# Altium footprint library My Library.PCBLIB: 198 footprints (part 12 of 13)
Each footprint in its own frame and in the unit in brackets; x right, y up, seen from the top. Pads: shape width x height; smd on the part's side, far side on the other; paste and mask are expansions set on the pad; w line width, h text height; cw(c..) or ccw(c..) is an arc to the next point about the centre after c.
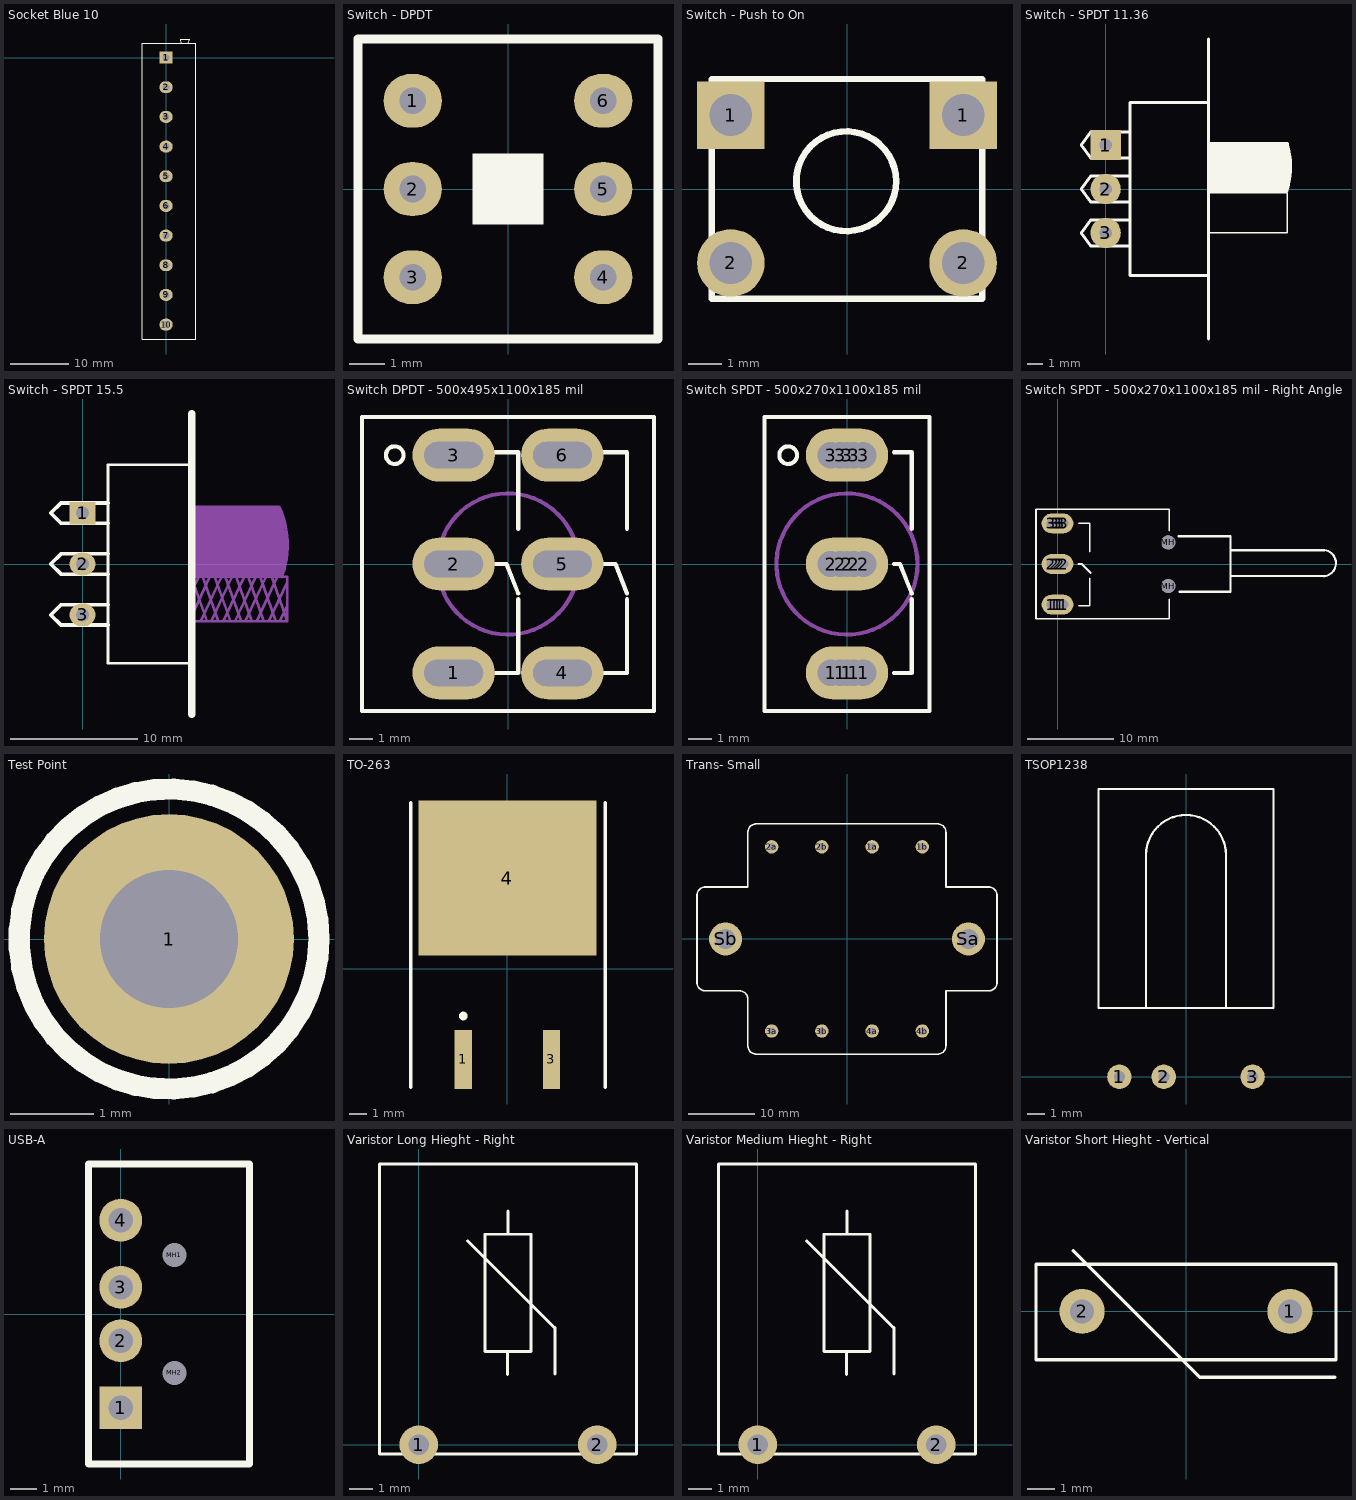
[diagram p11: the footprints below, top view; thin cyan lines are the x and y axes]

## Socket Blue 10 [mil]
pads (10):
  rect 90x80 hole 46: 1(0,0)
  oval 90x80 hole 46: 2(0,-200) 3(0,-400) 4(0,-600) 5(0,-800) 6(0,-1000) 7(0,-1200) 8(0,-1400) 9(0,-1600) 10(0,-1800)
Top Overlay:
  lines w7: 100,97 95.33,125 159.33,125 150,97 ; -160,-1897 200,-1897 200,97 -160,97 -160,-1897
3D body "Socket Blue_10Pin.STEP": height 493, standoff -263.18, extent -160.5,-1896 196.5,127

## Switch - DPDT [mil]
pads (6):
  oval 65x60 hole 30: 1(-106.3,98.43) 2(-106.3,0) 3(-106.3,-98.43) 4(106.3,-98.43) 5(106.3,0) 6(106.3,98.43)
Top Overlay:
  rectangle: -39.37,-39.37 39.37,39.37
  lines w10: -167.32,-167.32 -167.32,167.32 167.32,167.32 167.32,-167.32 -167.32,-167.32
3D body "DPDT.STEP": height 559.06, standoff -129.92, extent -167.32,-167.32 167.32,167.32

## Switch - Push to On [mil]
pads (4):
  rect 80x80 hole 50: 1(-137.5,87.5) 1(137.5,87.5)
  round 80 hole 50: 2(-137.5,-87.5) 2(137.5,-87.5)
Top Overlay:
  circle w7.87: c-0.89,9.15 r59.06
  lines w7: -160,130 160,130
  lines w7.87: -160,130 -160,-130 160,-130 160,130
3D body "SW3dPS-Touche DTS-6X_V2008.STEP": height 205.04, standoff -120.04, extent -154.9,-121.09 156.9,123

## Switch - SPDT 11.36 [mm]
pads (3):
  rect 2x2 hole 0.8: 1(0,2.9)
  round 2 hole 0.8: 2(0,0) 3(0,-2.9)
Top Overlay:
  rectangle: 6.8,-0.2 11.982,2.998
  lines w0.1: 6.8,-2.9 11.99,-2.9 11.99,-0.282
  lines w0.2: 1.6,-3.75 -1,-3.75 -1.6,-2.9 -1,-2.05 1.6,-2.05 ; 1.6,-0.85 -1,-0.85 -1.6,0 -1,0.85 1.6,0.85 ; 1.6,2.05 -1,2.05 -1.6,2.9 -1,3.75 1.6,3.75 ; 6.8,-9.9 6.8,9.9 ; 6.8,-5.7 1.6,-5.7 1.6,5.7 6.8,5.7 ; 6.8,-0.2 11.932,-0.201 ccw(c6.8,1.48) 11.982,2.998 6.8,3
  lines w0.3: 12.01,0.47 12.01,2.5

## Switch - SPDT 15.5 [mil]
pads (3):
  rect 80x70 hole 40: 1(0,157.48)
  oval 80x70 hole 40: 2(0,0) 3(0,-157.48)
Top Overlay:
  lines w7.87: 338.58,-307.09 78.74,-307.09 78.74,307.09 338.58,307.09
  lines w11.81: 78.74,-188.98 -66.93,-188.98 -98.43,-157.48 -66.93,-125.98 78.74,-125.98 ; 78.74,-31.5 -66.93,-31.5 -98.43,0 -66.93,31.5 78.74,31.5 ; 78.74,125.98 -66.93,125.98 -98.43,157.48 -66.93,188.98 78.74,188.98
  lines w23.62: 338.58,-464.57 338.58,464.57
Mechanical 3:
  rectangle: 338.58,-39.37 607.48,177.17
  rectangle: 596.06,12.2 631.5,105.51
  rectangle: 596.06,-40.38 617.04,12.2
  rectangle: 617.04,-14.17 627.56,22.44
  rectangle: 596.06,105.51 624.41,135.83
  rectangle: 596.06,135.83 619.68,164.17
  rectangle: 596.06,158.66 612.6,168.11
  rectangle: 607.87,-23.62 622.44,-9.06
  lines w7.87: 331.5,-174.02 394.09,-39.37 ; 337.01,-39.37 385.43,-177.17 ; 338.58,-177.17 633.86,-177.17 ; 338.58,-83.86 359.45,-39.37 ; 338.58,-39.37 633.86,-39.37 633.86,-177.17 ; 338.58,177.17 607.48,177.17 ; 366.14,-177.17 428.74,-42.52 ; 371.65,-39.37 420.08,-177.17 ; 398.82,-177.17 461.42,-42.52 ; 409.84,-39.37 458.27,-177.17 ; 436.22,-177.17 498.82,-42.52 ; 442.52,-39.37 490.94,-177.17 ; 472.05,-177.17 534.65,-42.52 ; 475.98,-39.37 524.41,-177.17 ; 503.94,-177.17 566.54,-42.52 ; 512.99,-39.37 561.42,-177.17 ; 538.98,-177.17 601.57,-42.52 ; 550.39,-39.37 598.82,-177.17 ; 577.17,-177.17 633.86,-56.69 ; 585.43,-39.37 633.86,-177.17 ; 611.02,-177.17 633.86,-128.35
  lines w10: 608.82,176.89 cw(c338.58,57.87) 617.36,-39.48
3D body "spdt.STEP": height 356.3, standoff -157.48, extent -68.5,-462.01 659.84,462.01

## Switch DPDT - 500x495x1100x185 mil [mil]
pads (6):
  oval 140x90 hole 45 slot 100 at 0 deg: 1(-92.5,-185) 2(-92.5,0) 3(-92.5,185) 4(92.5,-185) 5(92.5,0) 6(92.5,185)
Top Overlay:
  circle w7: c-192.5,185 r15
  lines w7: -42.5,0 -2.5,0 17.5,-50 ; -27.5,190 17.5,190 17.5,60 ; -22.5,-185 17.5,-185 17.5,-60 ; 142.5,0 182.5,0 202.5,-50 ; 157.5,190 202.5,190 202.5,60 ; 162.5,-185 202.5,-185 202.5,-60 ; -248,-250 -248,250 248,250 248,-250 -248,-250
Mechanical 1:
  circle w7: c0,0 r120
3D body "SWITCH DPDT.STEP": height 1121.73, standoff -100, extent -246.5,-250 248.5,250

## Switch SPDT - 500x270x1100x185 mil [mil]
pads (15):
  round 40 hole 45: 1(-27.56,-185.04) 1(-11.81,-185.04) 1(11.81,-185.04) 1(27.56,-185.04) 2(-27.56,0) 2(-11.81,0) 2(11.81,0) 2(27.56,0) 3(-27.56,185.04) 3(-11.81,185.04) 3(11.81,185.04) 3(27.56,185.04)
  oval 140x90 hole 45: 1(0,-185) 2(0,0) 3(0,185)
Top Overlay:
  circle w7: c-100,185 r15
  lines w7: 79.72,-185 110,-185 110,-60 ; 79.72,0 90,0 110,-50 ; 79.72,190 110,190 110,60 ; -140,-250 -140,250 140,250 140,-250 -140,-250
Mechanical 1:
  circle w7: c0,0 r120
3D body "SWITCH SPDT.STEP": height 1126.73, standoff -95, extent -134.47,-250 135.53,250

## Switch SPDT - 500x270x1100x185 mil - Right Angle [mil]
pads (17):
  round 90 hole 45: 1(-27.56,-185.04) 1(-11.81,-185.04) 1(11.81,-185.04) 1(27.56,-185.04) 2(-27.56,0) 2(-11.81,0) 2(11.81,0) 2(27.56,0) 3(-27.56,185.04) 3(-11.81,185.04) 3(11.81,185.04) 3(27.56,185.04)
  oval 140x90 hole 45: 1(0,-185) 2(0,0) 3(0,185)
  round 63 hole 65: MH(503.94,-100.36) MH(503.94,98.43)
Top Overlay:
  lines w7: 96,-190 147,-190 147,-65 ; 97,185 147,185 147,55 ; 507.87,-160 507.87,-250 -98,-250 -98,250 507.87,250 507.87,151
  lines w10: 96,0 110,0 150,-40 ; 551,125.98 787.4,125.98 787.4,-125.98 555,-125.98 ; 787.4,62.99 1216.54,62.99 cw(c1208.66,3.94) 1213.81,-55.42 ; 791.34,-55.12 1213.78,-55.12
3D body "SW3dPS-Switch toggle NKK M2012SA2W30.STEP": height 317.31, standoff -164.5, extent -22.64,-256 1269.05,256

## Test Point [mm]
pads (1):
  round 3 hole 1.651: 1(0,0)
Top Overlay:
  circle w0.254: c0,0 r1.8
3D body "User Library-testpoint.step": height 5.65, standoff -3.23, extent -1.587,-1.585 1.587,1.59

## TO-263 [mm] "L7800CD2T _ D2-PAK/TO-263-AB; 3 Leads (1 Cropped); Body 15.9 (inc. leads) x 10.4 mm (LxW max)"
height 4.6
pads (3):
  rect 1x3.4 smd: 1(-2.54,-5.225) 3(2.54,-5.225)
  rect 10.25x8.9 smd: 4(0,5.225)
Top Overlay:
  circle w0.25: c-2.54,-2.721 r0.125
  lines w0.2: -5.563,-6.833 -5.563,9.567 ; 5.639,-6.833 5.639,9.567
3D body "DPAK-TO-263.STEP": height 4.88, standoff -0.13, extent -5.08,-6.108 5.08,9.156

## Trans- Small [mil]
pads (10):
  round 80 hole 45: 1a(150,550) 1b(450,550) 2a(-450,550) 2b(-150,550) 3a(-450,-550) 3b(-150,-550) 4a(150,-550) 4b(450,-550)
  round 196.85 hole 118.11: Sa(725,0) Sb(-725,0)
Top Overlay:
  lines w10: -895.67,-260 ccw(c-845.67,-260) -845.67,-310 -642,-310 cw(c-642,-360) -592,-360 -592,-638 ccw(c-542,-638) -542,-688 541,-688 ccw(c541,-638) 591,-638 591,-310 845.67,-310 ccw(c845.67,-260) 895.67,-260 895.67,260 ccw(c845.67,260) 845.67,310 591,310 591,637 ccw(c541,637) 541,687 -542,687 ccw(c-542,637) -592,637 -592,310 -845.67,310 ccw(c-845.67,260) -895.67,260 -895.67,-260
3D body "trans9V-small.STEP": height 1051.18, standoff 11.81, extent -895.67,-482.28 895.67,482.28
3D body "1790319.stp": height 546.82, standoff -122.47, extent 91,417.13 591,688
3D body "1790319.stp": height 546.82, standoff -122.47, extent -509,416.13 -9,687
3D body "1790319.stp": height 546.82, standoff -122.47, extent -592,-688 -92,-417.13
3D body "1790319.stp": height 546.82, standoff -122.47, extent 8,-688 508,-417.13

## TSOP1238 [mil] "IR Sensor (TV Sensor)"
pads (3):
  round 55 hole 25: 1(-150,0) 2(-50,0) 3(150,0)
Top Overlay:
  lines w5: -90,155 -90,500 cw(c0,500) 90,500 90,155 ; -196.85,155 -196.85,648.48 196.85,648.48 196.85,155 -196.85,155
3D body "TSOP1238_2009.STEP": height 228.35, standoff -84.65, extent -196.85,-9 196.85,648.48

## USB-A [mm]
pads (6):
  rect 1.6x1.6 hole 0.92: 1(0,-3.5)
  round 1.6 hole 0.92: 2(0,-1) 3(0,1) 4(0,3.5)
  round 0.6 hole 0.9: MH1(2,2.2) MH2(2,-2.2)
Top Overlay:
  lines w0.254: -1.2,-5.6 4.8,-5.6 4.8,5.6 -1.2,5.6 -1.2,-5.6

## Varistor Long Hieght - Right [mil] "JVR10N331k With Long Hieght Legs and Right Angle"
pads (2):
  round 65 hole 35: 1(0,0) 2(300,0)
Top Overlay:
  lines w5: 82,343 228,197 229,197 229,119 ; 149,118 149,157 ; 150,354 150,393 ; -66.54,-16 366.54,-16 366.54,472.19 -66.54,472.19 -66.54,-16 ; 111,157 189,157 189,354 111,354 111,157
3D body "JVR10N331k_long_2009.STEP": height 349.69, standoff -98.43, extent -66.54,-16 366.54,472.19

## Varistor Medium Hieght - Right [mil] "JVR10N331k With Medium Hieght Legs and Right Angle"
pads (2):
  round 65 hole 35: 1(0,0) 2(300,0)
Top Overlay:
  lines w5: 82,343 228,197 229,197 229,119 ; 149,118 149,157 ; 150,354 150,393 ; -66.54,-16 -66.54,472.19 366.54,472.19 366.54,-16 -66.54,-16 ; 111,157 111,354 189,354 189,157 111,157
3D body "JVR10N331k_medium_2009.STEP": height 270.7, standoff -98.43, extent -66.54,-16 366.54,472.19

## Varistor Short Hieght - Vertical [mil]
pads (2):
  round 65 hole 35: 1(150,0) 2(-150,0)
Top Overlay:
  lines w5: -162.5,87.5 20,-95 215,-95 ; -216.47,-69.99 -216.47,68.36 216.43,68.36 216.43,-69.99 -216.47,-69.99
3D body "JVR10N331k_vertical.STEP": height 472.44, standoff -98.43, extent -216.47,-69.99 216.43,68.36